# Altium footprint library Semi-ATE.PcbLib: 155 footprints (part 1 of 10)
Each footprint in its own frame and in the unit in brackets; x right, y up, seen from the top. Pads: shape width x height; smd on the part's side, far side on the other; paste and mask are expansions set on the pad; w line width, h text height; cw(c..) or ccw(c..) is an arc to the next point about the centre after c.
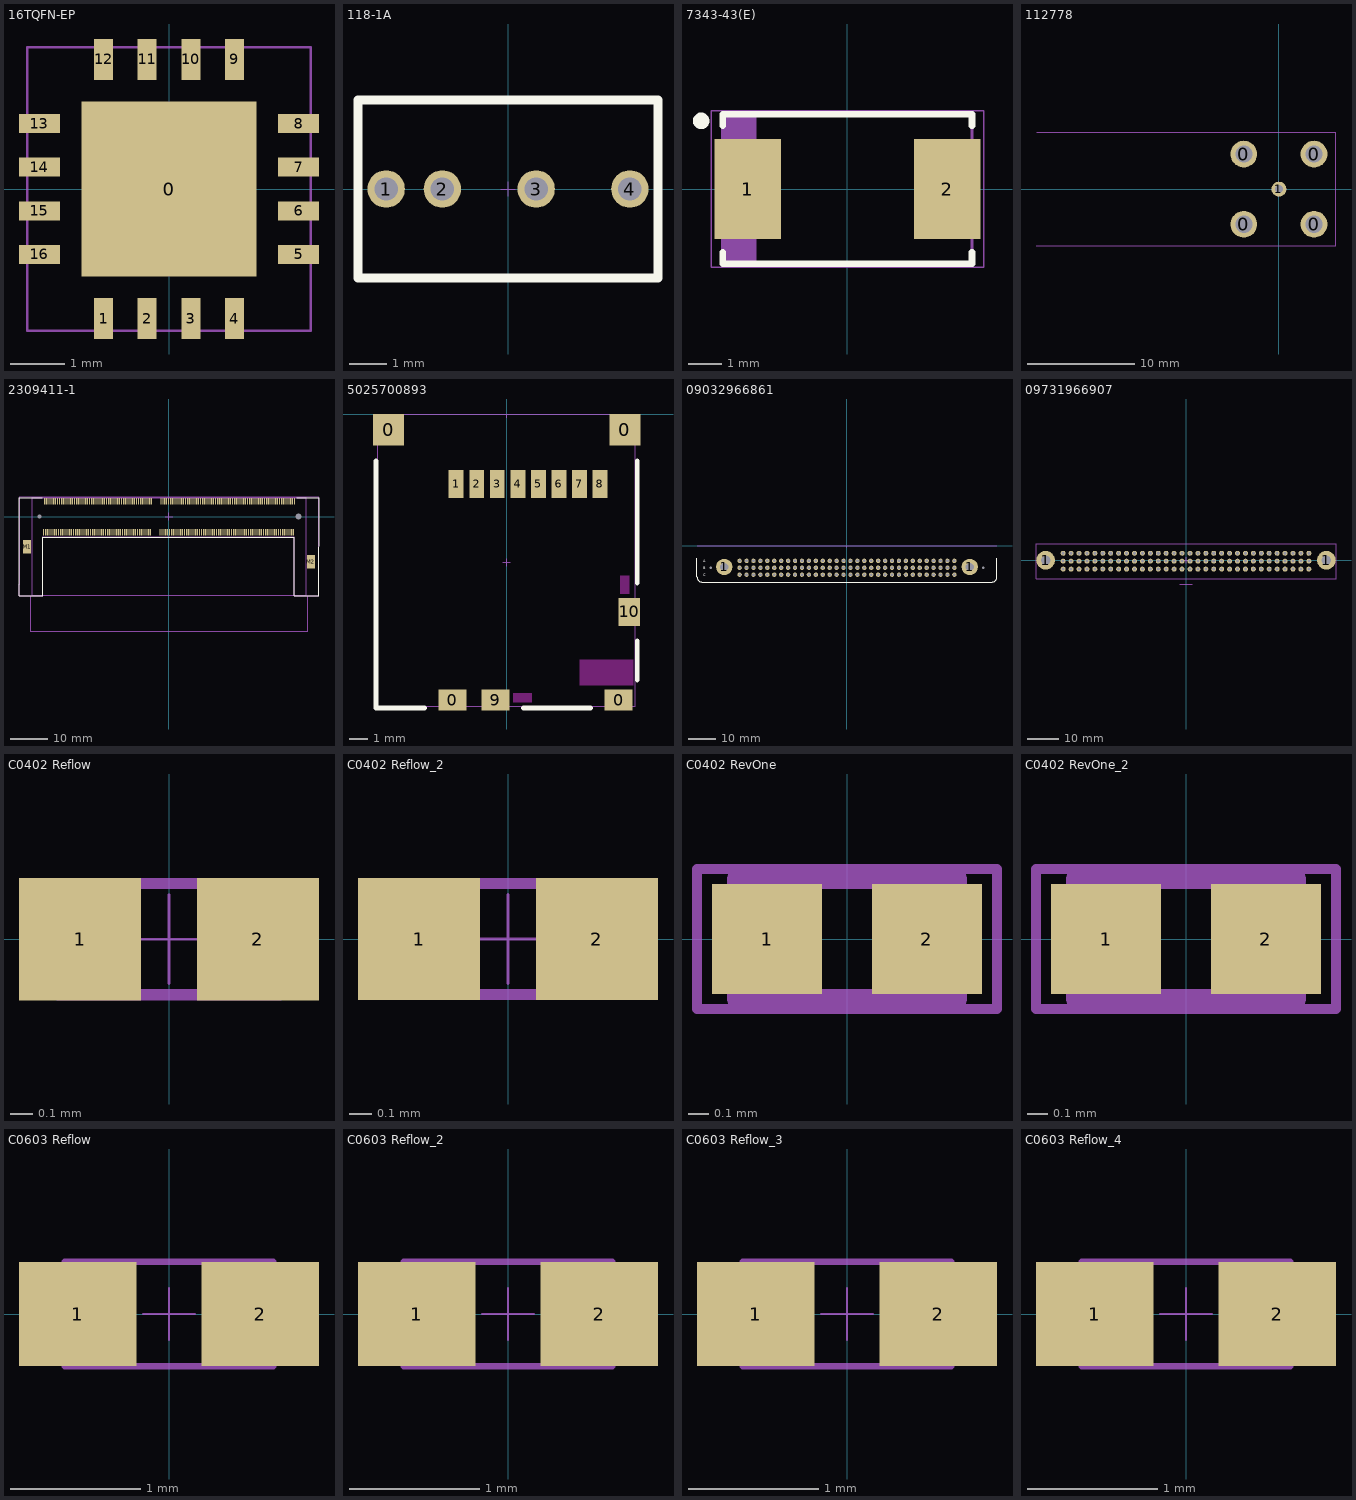
[diagram p0: the footprints below, top view; thin cyan lines are the x and y axes]

## 16TQFN-EP [mm] "Maxim"
pads (17):
  rect 3.2x3.2 smd: 0(0,0)
  rect 0.35x0.75 smd: 1(-1.2,-2.375) 2(-0.4,-2.375) 3(0.4,-2.375) 4(1.2,-2.375) 9(1.2,2.375) 10(0.4,2.375) 11(-0.4,2.375) 12(-1.2,2.375)
  rect 0.75x0.35 smd: 5(2.375,-1.2) 6(2.375,-0.4) 7(2.375,0.4) 8(2.375,1.2) 13(-2.375,1.2) 14(-2.375,0.4) 15(-2.375,-0.4) 16(-2.375,-1.2)
Top Overlay:
  text "." at -2.4,-2.4 h1
Top Designator:
  text ".Designator" at -7.618,-0.508 h1.52
Top 3D Body:
  lines w0.05: -2.6,-2.6 -2.6,2.6 2.6,2.6 2.6,-2.6 -2.6,-2.6
3D body "16TQFN-EP.STEP": height 0.8, standoff 0, extent -2.51,-2.51 2.51,2.51

## 118-1A [mil] "ATE Relay (NO)"
height 610
pads (4):
  round 40 hole 25: 1(-130,0) 2(-70,0) 3(30,0) 4(130,0)
Top Overlay:
  lines w10: -160,-95 -160,95 160,95 160,-95 -160,-95
Top Designator:
  text ".Designator" at -299.9,-19.99 h60
Top 3D Body:
  lines w1.97: -160.04,93.98 -160.04,-94.96 -160,-95 160,-95 160,95 -160,95
Bottom Gold Plating:
  lines w0.51: -7.87,0 7.87,0 ; 0,-7.87 0,7.87
3D body "118-1-A.STEP": height 600, standoff -124.8, extent -160.04,-95 160.04,93.98

## 7343-43(E) [mm] "Molded Tantal"
height 1.6
pads (2):
  rect 2x3 smd: 1(-3,0) 2(3,0)
Top Overlay:
  circle w0.25: c-4.4,2.05 r0.125
  lines w0.2: -3.75,-1.9 -3.75,-2.25 3.75,-2.25 3.75,-1.9 ; -3.75,1.9 -3.75,2.25 3.75,2.25 3.75,1.9
Top Designator:
  text ".Designator" at -7.88,-0.508 h1.52
Top 3D Body:
  lines w0.05: -4.1,-2.35 -4.1,2.35 4.1,2.35 4.1,-2.35 -4.1,-2.35
Bottom 3D Body:
  rectangle: -3.75,-2.25 -2.741,2.25
  lines w0.1: -3.75,-2.25 -3.75,2.25 3.75,2.25 3.75,-2.25 -3.75,-2.25
3D body: height 4.1, standoff 0, extent -3.75,-2.25 3.75,2.25

## 112778 [mm] "BNC"
pads (5):
  round 2.5 hole 1.6 unplated: 0(-3.28,-3.28) 0(-3.28,3.28) 0(3.28,-3.28) 0(3.28,3.28)
  round 1.4 hole 0.75 unplated: 1(0,0)
Top Courtyard:
  lines w0.05: -22.7,-5.3 5.335,-5.3 5.335,5.335 -22.65,5.335
Top Designator:
  text ".Designator" at -16.302,-0.508 h1.52
Top Component Center:
  lines w0.05: -0.7,0 0.7,0 ; 0,-0.7 0,0.7 0,-0.7
3D body "112778.stp": height 11.74, standoff -3.24, extent -22.63,-5.26 5.26,5.26

## 2309411-1 [mm] "DDR4 SODIMM 260P 8.0H STD"
pads (264):
  rect 0.3x1.75 smd: 1(33.375,4.1) 2(33.125,-4.1) 3(32.875,4.1) 4(32.625,-4.1) 5(32.375,4.1) 6(32.125,-4.1) 7(31.875,4.1) 8(31.625,-4.1) 9(31.375,4.1) 10(31.125,-4.1) 11(30.875,4.1) 12(30.625,-4.1) 13(30.375,4.1) 14(30.125,-4.1) 15(29.875,4.1) 16(29.625,-4.1) 17(29.375,4.1) 18(29.125,-4.1) 19(28.875,4.1) 20(28.625,-4.1) 21(28.375,4.1) 22(28.125,-4.1) 23(27.875,4.1) 24(27.625,-4.1) 25(27.375,4.1) 26(27.125,-4.1) 27(26.875,4.1) 28(26.625,-4.1) 29(26.375,4.1) 30(26.125,-4.1) 31(25.875,4.1) 32(25.625,-4.1) 33(25.375,4.1) 34(25.125,-4.1) 35(24.875,4.1) 36(24.625,-4.1) 37(24.375,4.1) 38(24.125,-4.1) 39(23.875,4.1) 40(23.625,-4.1) 41(23.375,4.1) 42(23.125,-4.1) 43(22.875,4.1) 44(22.625,-4.1) 45(22.375,4.1) 46(22.125,-4.1) 47(21.875,4.1) 48(21.625,-4.1) 49(21.375,4.1) 50(21.125,-4.1) 51(20.875,4.1) 52(20.625,-4.1) 53(20.375,4.1) 54(20.125,-4.1) 55(19.875,4.1) 56(19.625,-4.1) 57(19.375,4.1) 58(19.125,-4.1) 59(18.875,4.1) 60(18.625,-4.1) 61(18.375,4.1) 62(18.125,-4.1) 63(17.875,4.1) 64(17.625,-4.1) 65(17.375,4.1) 66(17.125,-4.1) 67(16.875,4.1) 68(16.625,-4.1) 69(16.375,4.1) 70(16.125,-4.1) 71(15.875,4.1) 72(15.625,-4.1) 73(15.375,4.1) 74(15.125,-4.1) 75(14.875,4.1) 76(14.625,-4.1) 77(14.375,4.1) 78(14.125,-4.1) 79(13.875,4.1) 80(13.625,-4.1) 81(13.375,4.1) 82(13.125,-4.1) 83(12.875,4.1) 84(12.625,-4.1) 85(12.375,4.1) 86(12.125,-4.1) 87(11.875,4.1) 88(11.625,-4.1) 89(11.375,4.1) 90(11.125,-4.1) 91(10.875,4.1) 92(10.625,-4.1) 93(10.375,4.1) 94(10.125,-4.1) 95(9.875,4.1) 96(9.625,-4.1) 97(9.375,4.1) 98(9.125,-4.1) 99(8.875,4.1) 100(8.625,-4.1) 101(8.375,4.1) 102(8.125,-4.1) 103(7.875,4.1) 104(7.625,-4.1) 105(7.375,4.1) 106(7.125,-4.1) 107(6.875,4.1) 108(6.625,-4.1) 109(6.375,4.1) 110(6.125,-4.1) 111(5.875,4.1) 112(5.625,-4.1) 113(5.375,4.1) 114(5.125,-4.1) 115(4.875,4.1) 116(4.625,-4.1) 117(4.375,4.1) 118(4.125,-4.1) 119(3.875,4.1) 120(3.625,-4.1) 121(3.375,4.1) 122(3.125,-4.1) 123(2.875,4.1) 124(2.625,-4.1) 125(2.375,4.1) 126(2.125,-4.1) 127(1.875,4.1) 128(1.625,-4.1) 129(1.375,4.1) 130(1.125,-4.1) 131(0.875,4.1) 132(0.625,-4.1) 133(0.375,4.1) 134(0.125,-4.1) 135(-0.125,4.1) 136(-0.375,-4.1) 137(-0.625,4.1) 138(-0.875,-4.1) 139(-1.125,4.1) 140(-1.375,-4.1) 141(-1.625,4.1) 142(-1.875,-4.1) 143(-2.125,4.1) 144(-2.375,-4.1) 145(-4.625,4.1) 146(-4.875,-4.1) 147(-5.125,4.1) 148(-5.375,-4.1) 149(-5.625,4.1) 150(-5.875,-4.1) 151(-6.125,4.1) 152(-6.375,-4.1) 153(-6.625,4.1) 154(-6.875,-4.1) 155(-7.125,4.1) 156(-7.375,-4.1) 157(-7.625,4.1) 158(-7.875,-4.1) 159(-8.125,4.1) 160(-8.375,-4.1) 161(-8.625,4.1) 162(-8.875,-4.1) 163(-9.125,4.1) 164(-9.375,-4.1) 165(-9.625,4.1) 166(-9.875,-4.1) 167(-10.125,4.1) 168(-10.375,-4.1) 169(-10.625,4.1) 170(-10.875,-4.1) 171(-11.125,4.1) 172(-11.375,-4.1) 173(-11.625,4.1) 174(-11.875,-4.1) 175(-12.125,4.1) 176(-12.375,-4.1) 177(-12.625,4.1) 178(-12.875,-4.1) 179(-13.125,4.1) 180(-13.375,-4.1) 181(-13.625,4.1) 182(-13.875,-4.1) 183(-14.125,4.1) 184(-14.375,-4.1) 185(-14.625,4.1) 186(-14.875,-4.1) 187(-15.125,4.1) 188(-15.375,-4.1) 189(-15.625,4.1) 190(-15.875,-4.1) 191(-16.125,4.1) 192(-16.375,-4.1) 193(-16.625,4.1) 194(-16.875,-4.1) 195(-17.125,4.1) 196(-17.375,-4.1) 197(-17.625,4.1) 198(-17.875,-4.1) 199(-18.125,4.1) 200(-18.375,-4.1) 201(-18.625,4.1) 202(-18.875,-4.1) 203(-19.125,4.1) 204(-19.375,-4.1) 205(-19.625,4.1) 206(-19.875,-4.1) 207(-20.125,4.1) 208(-20.375,-4.1) 209(-20.625,4.1) 210(-20.875,-4.1) 211(-21.125,4.1) 212(-21.375,-4.1) 213(-21.625,4.1) 214(-21.875,-4.1) 215(-22.125,4.1) 216(-22.375,-4.1) 217(-22.625,4.1) 218(-22.875,-4.1) 219(-23.125,4.1) 220(-23.375,-4.1) 221(-23.625,4.1) 222(-23.875,-4.1) 223(-24.125,4.1) 224(-24.375,-4.1) 225(-24.625,4.1) 226(-24.875,-4.1) 227(-25.125,4.1) 228(-25.375,-4.1) 229(-25.625,4.1) 230(-25.875,-4.1) 231(-26.125,4.1) 232(-26.375,-4.1) 233(-26.625,4.1) 234(-26.875,-4.1) 235(-27.125,4.1) 236(-27.375,-4.1) 237(-27.625,4.1) 238(-27.875,-4.1) 239(-28.125,4.1) 240(-28.375,-4.1) 241(-28.625,4.1) 242(-28.875,-4.1) 243(-29.125,4.1) 244(-29.375,-4.1) 245(-29.625,4.1) 246(-29.875,-4.1) 247(-30.125,4.1) 248(-30.375,-4.1) 249(-30.625,4.1) 250(-30.875,-4.1) 251(-31.125,4.1) 252(-31.375,-4.1) 253(-31.625,4.1) 254(-31.875,-4.1) 255(-32.125,4.1) 256(-32.375,-4.1) 257(-32.625,4.1) 258(-32.875,-4.1) 259(-33.125,4.1) 260(-33.375,-4.1)
  rect 2x3.5 smd: M1(-37.75,-8) M2(37.75,-12)
  round 0 hole 1.1 unplated: P1(-34.4,0)
  round 0 hole 1.6 unplated: P1(34.4,0)
Top Overlay:
  lines w0.2: -33.75,5 -39.878,5 -39.878,-21 -33.528,-21 -33.528,-5.5 33.274,-5.5 33.274,-21 39.878,-21 39.878,5 34,5
Top Designator:
  text ".Designator" at -7.618,-13.103 h1.52
Top 3D Body:
  lines w0.05: -39.878,-21.082 -39.878,-18.034 -39.878,5.334 39.878,5.334 39.878,-18.034 39.878,-21.082 36.83,-21.082 33.274,-21.082 33.274,-5.334 -33.528,-5.334 -33.528,-21.082 -36.83,-21.082 -39.878,-21.082
Bottom 3D Body:
  lines w0.1: -36.5,-20.85 36.5,-20.85 36.5,5 -36.5,5 -36.5,-20.85
Bottom Component Outline:
  lines w0.1: -36.83,-21.082 -36.83,-30.5 36.825,-30.5 ; 36.83,-30.5 36.83,-21.082
Bottom Gold Plating:
  lines w0.1: -1,0 1,0 ; 0,-1 0,1
3D body "2309411-1.STEP": height 8.07, standoff -0.42, extent -38.52,-20.845 38.504,5.005

## 5025700893 [mm] "MicroSD Cage (Molex)"
pads (14):
  rect 1.65x1.7 smd: 0(-6.325,-0.85) 0(6.337,-0.85)
  rect 1.5x1.15 smd: 0(-2.9,-15.325) 0(6,-15.325) 9(-0.6,-15.325)
  rect 0.8x1.5 smd: 1(-2.7,-3.75) 2(-1.6,-3.75) 3(-0.5,-3.75) 4(0.6,-3.75) 5(1.7,-3.75) 6(2.8,-3.75) 7(3.9,-3.75) 8(5,-3.75)
  rect 1.15x1.5 smd: 10(6.575,-10.6)
Top Layer keep-out:
  rectangle: 0.35,-15.45 1.35,-14.95
  rectangle: 3.9,-14.55 6.8,-13.15
  rectangle: 6.075,-9.65 6.575,-8.65
Top Overlay:
  lines w0.254: -7,-2.501 -7,-15.75 -4.4,-15.75 ; 0.9,-15.75 4.5,-15.75 ; 6.999,-2.502 7,-9.05 ; 7,-14.25 7,-12.15
Top Designator:
  text ".Designator" at -7.611,-7.734 h1.52
Top 3D Body:
  lines w0.05: -6.9,-15.65 -6.9,0 0,0 6.9,0 6.9,-15.65 -6.9,-15.65
Bottom Gold Plating:
  lines w0.012: 0,-0.204 0,0
  lines w0.013: -5.05,0 4.9,0 ; -0.2,-7.95 0.2,-7.95 ; 0,-8.15 0,-7.75
3D body "5025700893.step": height 1.8, standoff 0, extent -6.9,-15.65 6.9,1.55

## 09032966861 [mm] "CONN DIN HDR 96POS Female"
pads (100):
  round 0.5 hole 1 unplated paste+0.1 mask-1: 0(-50,-8.03) 0(50,-8.03)
  round 6 hole 3 paste-3 mask+0.1: 1(-45,-7.73) 1(45,-7.73)
  round 1.6 hole 1: A1(-39.37,-5.49) A2(-36.83,-5.49) A3(-34.29,-5.49) A4(-31.75,-5.49) A5(-29.21,-5.49) A6(-26.67,-5.49) A7(-24.13,-5.49) A8(-21.59,-5.49) A9(-19.05,-5.49) A10(-16.51,-5.49) A11(-13.97,-5.49) A12(-11.43,-5.49) A13(-8.89,-5.49) A14(-6.35,-5.49) A15(-3.81,-5.49) A16(-1.27,-5.49) A17(1.27,-5.49) A18(3.81,-5.49) A19(6.35,-5.49) A20(8.89,-5.49) A21(11.43,-5.49) A22(13.97,-5.49) A23(16.51,-5.49) A24(19.05,-5.49) A25(21.59,-5.49) A26(24.13,-5.49) A27(26.67,-5.49) A28(29.21,-5.49) A29(31.75,-5.49) A30(34.29,-5.49) A31(36.83,-5.49) A32(39.37,-5.49) B1(-39.37,-8.03) B2(-36.83,-8.03) B3(-34.29,-8.03) B4(-31.75,-8.03) B5(-29.21,-8.03) B6(-26.67,-8.03) B7(-24.13,-8.03) B8(-21.59,-8.03) B9(-19.05,-8.03) B10(-16.51,-8.03) B11(-13.97,-8.03) B12(-11.43,-8.03) B13(-8.89,-8.03) B14(-6.35,-8.03) B15(-3.81,-8.03) B16(-1.27,-8.03) B17(1.27,-8.03) B18(3.81,-8.03) B19(6.35,-8.03) B20(8.89,-8.03) B21(11.43,-8.03) B22(13.97,-8.03) B23(16.51,-8.03) B24(19.05,-8.03) B25(21.59,-8.03) B26(24.13,-8.03) B27(26.67,-8.03) B28(29.21,-8.03) B29(31.75,-8.03) B30(34.29,-8.03) B31(36.83,-8.03) B32(39.37,-8.03) C1(-39.37,-10.57) C2(-36.83,-10.57) C3(-34.29,-10.57) C4(-31.75,-10.57) C5(-29.21,-10.57) C6(-26.67,-10.57) C7(-24.13,-10.57) C8(-21.59,-10.57) C9(-19.05,-10.57) C10(-16.51,-10.57) C11(-13.97,-10.57) C12(-11.43,-10.57) C13(-8.89,-10.57) C14(-6.35,-10.57) C15(-3.81,-10.57) C16(-1.27,-10.57) C17(1.27,-10.57) C18(3.81,-10.57) C19(6.35,-10.57) C20(8.89,-10.57) C21(11.43,-10.57) C22(13.97,-10.57) C23(16.51,-10.57) C24(19.05,-10.57) C25(21.59,-10.57) C26(24.13,-10.57) C27(26.67,-10.57) C28(29.21,-10.57) C29(31.75,-10.57) C30(34.29,-10.57) C31(36.83,-10.57) C32(39.37,-10.57)
Top Overlay:
  lines w0.254: -55,-4.5 -55,-11.3 ccw(c-53,-11.3) -53,-13.3 ; -53.02,-13.3 53,-13.3 ccw(c53,-11.3) 55,-11.3 55,-4.5
  text "A" at -52.718,-6.023 h1
  text "C" at -52.733,-11.068 h1
  text "B" at -52.713,-8.549 h1
  text "." at -39.6,-3.96 h1
Top Designator:
  text ".Designator" at -7.618,-7.218 h1.52
Bottom Gold Plating:
  lines w0.012: -54.9,0 54.9,0 ; 0,-0.5 0,0

## 09731966907 [mm] "CONN DIN HDR 96POS Male"
pads (98):
  round 6 hole 3 paste-3 mask+0.1: 1(-45,0) 1(45,0)
  round 1.6 hole 1: A1(-39.37,2.24) A2(-36.83,2.24) A3(-34.29,2.24) A4(-31.75,2.24) A5(-29.21,2.24) A6(-26.67,2.24) A7(-24.13,2.24) A8(-21.59,2.24) A9(-19.05,2.24) A10(-16.51,2.24) A11(-13.97,2.24) A12(-11.43,2.24) A13(-8.89,2.24) A14(-6.35,2.24) A15(-3.81,2.24) A16(-1.27,2.24) A17(1.27,2.24) A18(3.81,2.24) A19(6.35,2.24) A20(8.89,2.24) A21(11.43,2.24) A22(13.97,2.24) A23(16.51,2.24) A24(19.05,2.24) A25(21.59,2.24) A26(24.13,2.24) A27(26.67,2.24) A28(29.21,2.24) A29(31.75,2.24) A30(34.29,2.24) A31(36.83,2.24) A32(39.37,2.24) B1(-39.37,-0.3) B2(-36.83,-0.3) B3(-34.29,-0.3) B4(-31.75,-0.3) B5(-29.21,-0.3) B6(-26.67,-0.3) B7(-24.13,-0.3) B8(-21.59,-0.3) B9(-19.05,-0.3) B10(-16.51,-0.3) B11(-13.97,-0.3) B12(-11.43,-0.3) B13(-8.89,-0.3) B14(-6.35,-0.3) B15(-3.81,-0.3) B16(-1.27,-0.3) B17(1.27,-0.3) B18(3.81,-0.3) B19(6.35,-0.3) B20(8.89,-0.3) B21(11.43,-0.3) B22(13.97,-0.3) B23(16.51,-0.3) B24(19.05,-0.3) B25(21.59,-0.3) B26(24.13,-0.3) B27(26.67,-0.3) B28(29.21,-0.3) B29(31.75,-0.3) B30(34.29,-0.3) B31(36.83,-0.3) B32(39.37,-0.3) C1(-39.37,-2.84) C2(-36.83,-2.84) C3(-34.29,-2.84) C4(-31.75,-2.84) C5(-29.21,-2.84) C6(-26.67,-2.84) C7(-24.13,-2.84) C8(-21.59,-2.84) C9(-19.05,-2.84) C10(-16.51,-2.84) C11(-13.97,-2.84) C12(-11.43,-2.84) C13(-8.89,-2.84) C14(-6.35,-2.84) C15(-3.81,-2.84) C16(-1.27,-2.84) C17(1.27,-2.84) C18(3.81,-2.84) C19(6.35,-2.84) C20(8.89,-2.84) C21(11.43,-2.84) C22(13.97,-2.84) C23(16.51,-2.84) C24(19.05,-2.84) C25(21.59,-2.84) C26(24.13,-2.84) C27(26.67,-2.84) C28(29.21,-2.84) C29(31.75,-2.84) C30(34.29,-2.84) C31(36.83,-2.84) C32(39.37,-2.84)
Bottom Overlay:
  text "1" at -39.6,-4.5 h1
  text "." at -39.4,4 h1
  text "A" at 41,2.806 h1
  text "B" at 41,0.266 h1
  text "C" at 41,-2.274 h1
  text "A" at -41.403,2.752 h1
  text "B" at -41.403,0.212 h1
  text "C" at -41.403,-2.328 h1
Board Outline:
  lines w0.05: -2,-7.73 2,-7.73
Top Courtyard:
  lines w0.05: -48.075,-5.925 48.075,-5.925 48.075,5.325 -48.075,5.325 -48.075,-5.925
Top Designator:
  text ".Designator" at -7.618,0.512 h1.52
Top Component Center:
  lines w0.05: -2,0 2,0 ; 0,-1 0,1
3D body "09731966907.STEP": height 21.6, standoff -3, extent -47.5,-5.85 47.5,5.25

## C0402 Reflow [mm] "SMT CAP 0402 Reflow Soldering"
pads (2):
  rect 0.55x0.55 smd: 1(-0.4,0) 2(0.4,0)
Top Solder:
  rectangle: -0.3,-0.376 0.3,0.378
Top Designator:
  text ".Designator" at -7.618,-0.507 h1.52
Top 3D Body:
  lines w0.05: -0.5,-0.25 0.5,-0.25 0.5,0.25 -0.5,0.25 -0.5,-0.25
Bottom Gold Plating:
  lines w0.013: -0.2,0 0.2,0 ; 0,-0.2 0,0.2
3D body "C0402.STEP": height 0.5, standoff 0, extent -0.5,-0.25 0.5,0.25

## C0402 Reflow_2 [mm]
pads (2):
  rect 0.55x0.55 smd: 1(-0.4,0) 2(0.4,0)
Top Solder:
  rectangle: -0.3,-0.376 0.3,0.378
Top Designator:
  text ".Designator" at -7.618,-0.507 h1.52
Top 3D Body:
  lines w0.05: -0.5,-0.25 -0.5,0.25 0.5,0.25 0.5,-0.25 -0.5,-0.25
Bottom Gold Plating:
  lines w0.013: -0.2,0 0.2,0 ; 0,-0.2 0,0.2
3D body "C0402.STEP": height 0.5, standoff 0, extent -0.5,-0.25 0.5,0.25

## C0402 RevOne [mm] "Chip Capacitor; Body 1.0x0.5mm (LxW typ), IPC High Density"
height 0.6
pads (2):
  rect 0.55x0.55 smd: 1(-0.4,0) 2(0.4,0)
Top Designator:
  text ".Designator" at -7.618,-0.508 h1.52
Top 3D Body:
  lines w0.05: -0.75,-0.35 0.75,-0.35 0.75,0.35 -0.75,0.35 -0.75,-0.35
Bottom 3D Body:
  lines w0.1: -0.55,-0.3 -0.55,0.3 0.55,0.3 0.55,-0.3 -0.55,-0.3
3D body: height 0.6, standoff 0, extent -0.55,-0.3 0.55,0.3

## C0402 RevOne_2 [mm]
pads (2):
  rect 0.55x0.55 smd: 1(-0.4,0) 2(0.4,0)
Top Designator:
  text ".Designator" at -7.618,-0.508 h1.52
Top 3D Body:
  lines w0.05: -0.75,-0.35 0.75,-0.35 0.75,0.35 -0.75,0.35 -0.75,-0.35
Bottom 3D Body:
  lines w0.1: -0.55,-0.3 -0.55,0.3 0.55,0.3 0.55,-0.3 -0.55,-0.3
3D body: height 0.6, standoff 0, extent -0.55,-0.3 0.55,0.3

## C0603 Reflow [mm] "SMT Capacitor 0603 Reflow Soldering"
height 10
pads (2):
  rect 0.9x0.8 smd: 1(-0.7,0) 2(0.7,0)
Top Designator:
  text ".Designator" at -7.618,-0.508 h1.52
Top 3D Body:
  lines w0.05: -0.8,-0.4 -0.8,0.4 0.8,0.4 0.8,-0.4 -0.8,-0.4
Bottom Gold Plating:
  lines w0.013: -0.2,0 0.2,0 ; 0,-0.2 0,0.2
3D body "C0603.STEP": height 0.8, standoff 0, extent -0.8,-0.4 0.8,0.4

## C0603 Reflow_2 [mm]
pads (2):
  rect 0.9x0.8 smd: 1(-0.7,0) 2(0.7,0)
Top Designator:
  text ".Designator" at -7.618,-0.508 h1.52
Top 3D Body:
  lines w0.05: -0.8,-0.4 0.8,-0.4 0.8,0.4 -0.8,0.4 -0.8,-0.4
Bottom Gold Plating:
  lines w0.013: -0.2,0 0.2,0 ; 0,-0.2 0,0.2
3D body "C0603.STEP": height 0.8, standoff 0, extent -0.8,-0.4 0.8,0.4

## C0603 Reflow_3 [mm]
pads (2):
  rect 0.9x0.8 smd: 1(-0.7,0) 2(0.7,0)
Top Designator:
  text ".Designator" at -7.618,-0.508 h1.52
Top 3D Body:
  lines w0.05: -0.8,-0.4 0.8,-0.4 0.8,0.4 -0.8,0.4 -0.8,-0.4
Bottom Gold Plating:
  lines w0.013: -0.2,0 0.2,0 ; 0,-0.2 0,0.2
3D body "C0603.STEP": height 0.8, standoff 0, extent -0.8,-0.4 0.8,0.4

## C0603 Reflow_4 [mm]
pads (2):
  rect 0.9x0.8 smd: 1(-0.7,0) 2(0.7,0)
Top Designator:
  text ".Designator" at -7.618,-0.508 h1.52
Top 3D Body:
  lines w0.05: -0.8,-0.4 0.8,-0.4 0.8,0.4 -0.8,0.4 -0.8,-0.4
Bottom Gold Plating:
  lines w0.013: -0.2,0 0.2,0 ; 0,-0.2 0,0.2
3D body "C0603.STEP": height 0.8, standoff 0, extent -0.8,-0.4 0.8,0.4